# Altium footprint library RF Module.PcbLib: 28 footprints (part 1 of 2)
Each footprint in its own frame and in the unit in brackets; x right, y up, seen from the top. Pads: shape width x height; smd on the part's side, far side on the other; paste and mask are expansions set on the pad; w line width, h text height; cw(c..) or ccw(c..) is an arc to the next point about the centre after c.
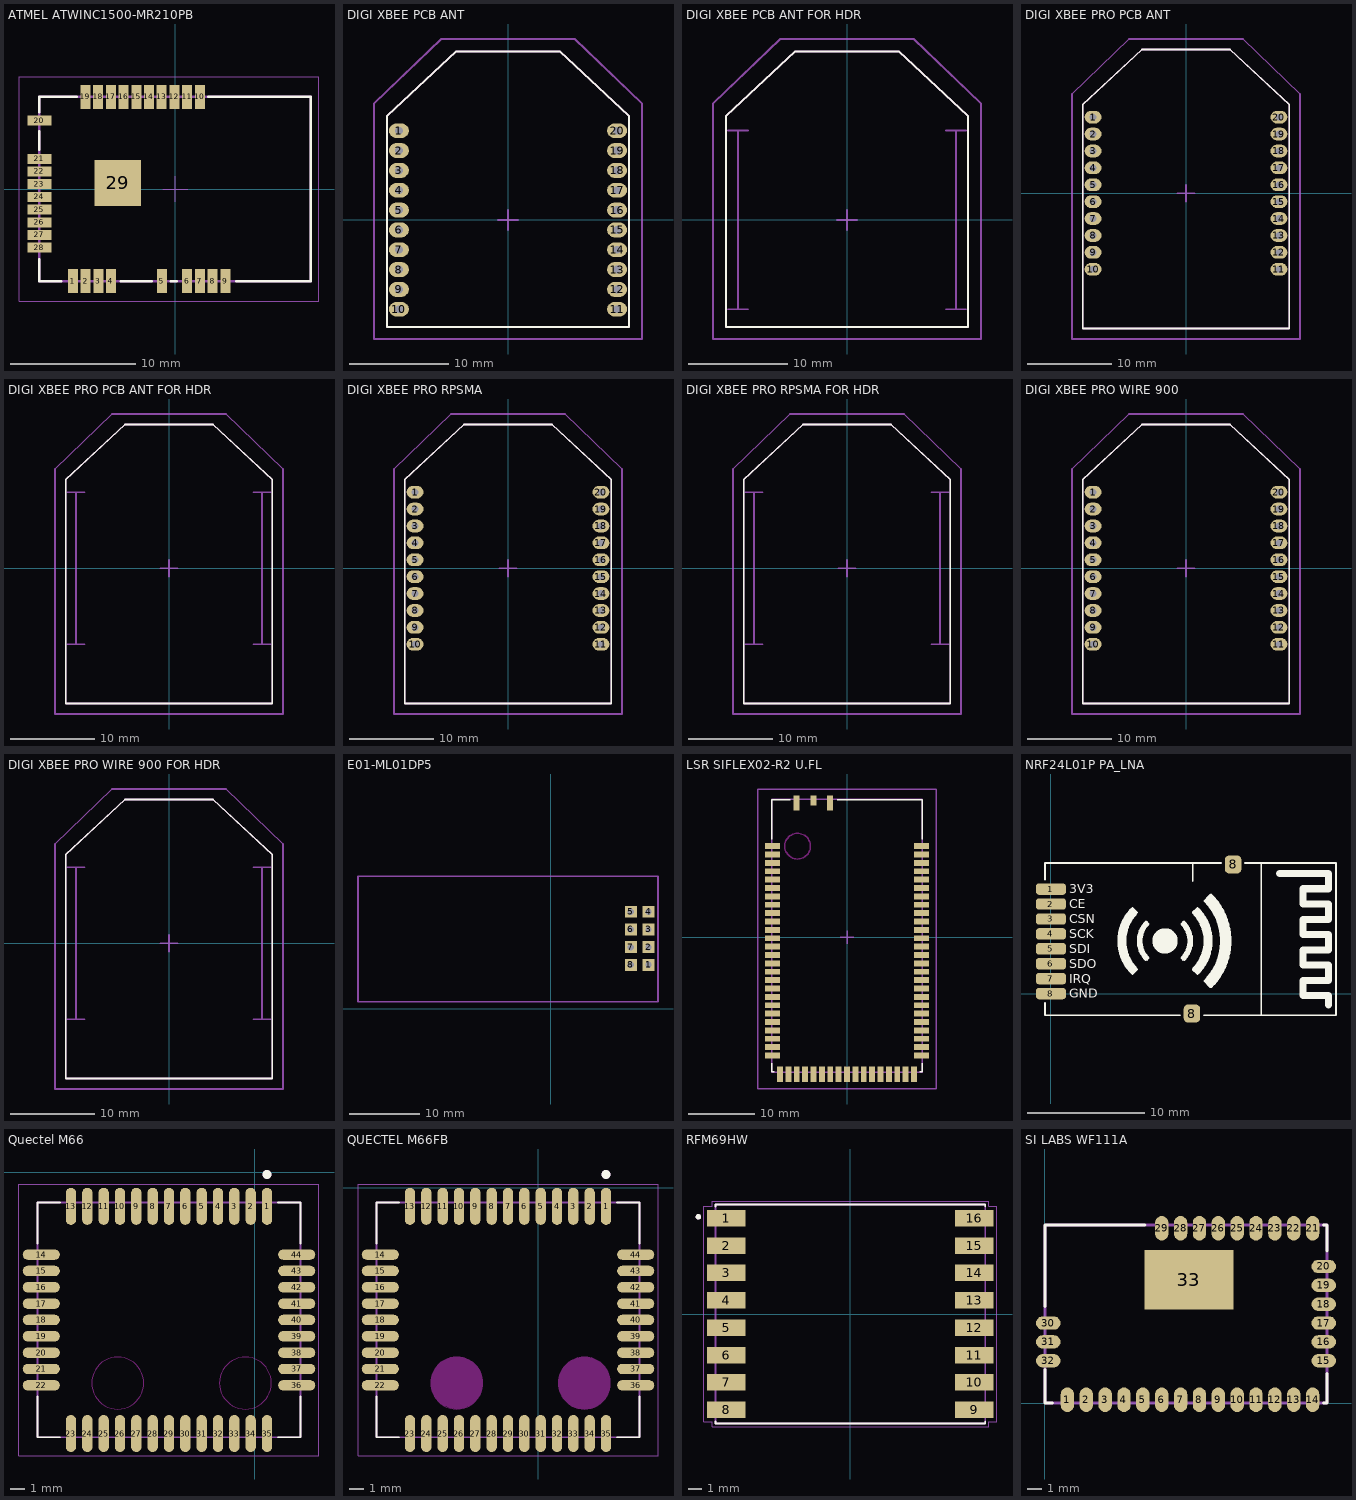
[diagram p0: the footprints below, top view; thin cyan lines are the x and y axes]

## ATMEL ATWINC1500-MR210PB [mm]
height 2.2
pads (29):
  rect 0.8x1.9 smd: 1(-8.19,-7.365) 2(-7.174,-7.365) 3(-6.158,-7.365) 4(-5.142,-7.365) 5(-1.078,-7.365) 6(0.954,-7.365) 7(1.97,-7.365) 8(2.986,-7.365) 9(4.002,-7.365) 10(1.964,7.365) 11(0.948,7.365) 12(-0.068,7.365) 13(-1.084,7.365) 14(-2.1,7.365) 15(-3.116,7.365) 16(-4.132,7.365) 17(-5.148,7.365) 18(-6.164,7.365) 19(-7.18,7.365)
  rect 1.9x0.8 smd: 20(-10.86,5.465) 21(-10.86,2.417) 22(-10.86,1.401) 23(-10.86,0.385) 24(-10.86,-0.631) 25(-10.86,-1.647) 26(-10.86,-2.663) 27(-10.86,-3.679) 28(-10.86,-4.695)
  rect 3.7x3.7 smd: 29(-4.59,0.485)
Top Overlay:
  lines w0.2: -10.86,-5.615 -10.86,-7.365 -9.11,-7.365 ; -10.86,3.135 -10.86,4.635 ; -10.86,6.135 -10.86,7.365 -7.86,7.365 ; -4.36,-7.365 -1.86,-7.365 ; -0.36,-7.365 0.14,-7.365 ; 2.64,7.365 10.86,7.365 10.86,-7.365 4.89,-7.365
Mechanical 1:
  lines w0.2: -10.86,-7.365 -10.86,7.365 10.86,7.365 10.86,-7.365 -10.86,-7.365
Mechanical 15:
  lines w0.1: -1,0 1,0 ; 0,-1 0,1 ; -12.5,-9 11.5,-9 11.5,9 -12.5,9 -12.5,-9
3D body "ATWINC1500-MR210PB.STEP": height 2.2, standoff 0, extent -10.86,-7.365 10.86,7.365

## DIGI XBEE PCB ANT [mm]
height 4
pads (20):
  oval 2x1.5 hole 0.8: 1(-11,9) 2(-11,7) 3(-11,5) 4(-11,3) 5(-11,1) 6(-11,-1) 7(-11,-3) 8(-11,-5) 9(-11,-7) 10(-11,-9) 11(11,-9) 12(11,-7) 13(11,-5) 14(11,-3) 15(11,-1) 16(11,1) 17(11,3) 18(11,5) 19(11,7) 20(11,9)
Top Overlay:
  lines w0.2: -12.2,-10.8 0,-10.8 12.2,-10.8 12.2,10.5 5.2,17 0,17 -5.2,17 -12.2,10.5 -12.2,-10.8
Mechanical 1:
  lines w0.2: -12.2,-10.8 -12.2,10.5 -5.2,17 0,17 5.2,17 12.2,10.5 12.2,-10.8 0,-10.8 -12.2,-10.8
Mechanical 15:
  lines w0.2: -1,0 1,0 ; 0,-1 0,1 ; -13.5,-12 -13.5,11.75 -6.75,18.25 6.75,18.25 13.5,11.75 13.5,-12 -13.5,-12
3D body "XBee PCB Antenna.STEP": height 3.58, standoff -4.17, extent -12.192,-10.8 12.192,16.97

## DIGI XBEE PCB ANT FOR HDR [mm]
height 8.4
Top Overlay:
  lines w0.2: -12.2,-10.8 0,-10.8 12.2,-10.8 12.2,10.5 5.2,17 0,17 -5.2,17 -12.2,10.5 -12.2,-10.8
Mechanical 1:
  lines w0.2: -12,-9 -11,-9 ; -12,9 -11,9 ; -10,-9 -11,-9 ; -10,9 -11,9 ; 10,-9 11,-9 ; 10,9 11,9 ; 12,-9 11,-9 ; 12,9 11,9 ; -11,-9 -11,9 ; 11,-9 11,9 ; -12.2,-10.8 -12.2,10.5 -5.2,17 0,17 5.2,17 12.2,10.5 12.2,-10.8 0,-10.8 -12.2,-10.8
Mechanical 15:
  lines w0.2: -1,0 1,0 ; 0,-1 0,1 ; -13.5,-12 -13.5,11.75 -6.75,18.25 6.75,18.25 13.5,11.75 13.5,-12 -13.5,-12
3D body "XBee PCB Antenna.STEP": height 7.98, standoff 0.23, extent -12.192,-10.8 12.192,16.97

## DIGI XBEE PRO PCB ANT [mm]
height 4
pads (20):
  oval 2x1.5 hole 0.8: 1(-11,9) 2(-11,7) 3(-11,5) 4(-11,3) 5(-11,1) 6(-11,-1) 7(-11,-3) 8(-11,-5) 9(-11,-7) 10(-11,-9) 11(11,-9) 12(11,-7) 13(11,-5) 14(11,-3) 15(11,-1) 16(11,1) 17(11,3) 18(11,5) 19(11,7) 20(11,9)
Top Overlay:
  lines w0.2: -12.2,-16 12.2,-16 12.2,10.5 5.2,17 0,17 -5.2,17 -12.2,10.5 -12.2,-16
Mechanical 1:
  lines w0.2: -12.2,-16 -12.2,10.5 -5.2,17 0,17 5.2,17 12.2,10.5 12.2,-16 -12.2,-16
Mechanical 15:
  lines w0.2: -1,0 1,0 ; 0,-1 0,1 ; -13.5,-17.25 -13.5,11.75 -6.75,18.25 6.75,18.25 13.5,11.75 13.5,-17.25 -13.5,-17.25
3D body "XBee Pro PCB Antenna.STEP": height 3.58, standoff -4.17, extent -12.192,-15.97 12.192,16.97

## DIGI XBEE PRO PCB ANT FOR HDR [mm]
height 4
Top Overlay:
  lines w0.2: -12.2,-16 -12.2,10.5 -5.2,17 0,17 5.2,17 12.2,10.5 12.2,-16 -12.2,-16
Mechanical 1:
  lines w0.2: -12,-9 -11,-9 ; -12,9 -11,9 ; -10,-9 -11,-9 ; -10,9 -11,9 ; 10,-9 11,-9 ; 10,9 11,9 ; 12,-9 11,-9 ; 12,9 11,9 ; -11,-9 -11,9 ; 11,-9 11,9 ; -12.2,-16 12.2,-16 12.2,10.5 5.2,17 0,17 -5.2,17 -12.2,10.5 -12.2,-16
Mechanical 15:
  lines w0.2: -1,0 1,0 ; 0,-1 0,1 ; -13.5,-17.25 13.5,-17.25 13.5,11.75 6.75,18.25 -6.75,18.25 -13.5,11.75 -13.5,-17.25
3D body "XBee Pro PCB Antenna.STEP": height 3.58, standoff -4.17, extent -12.192,-15.97 12.192,16.97

## DIGI XBEE PRO RPSMA [mm]
height 4
pads (20):
  oval 2x1.5 hole 0.8: 1(-11,9) 2(-11,7) 3(-11,5) 4(-11,3) 5(-11,1) 6(-11,-1) 7(-11,-3) 8(-11,-5) 9(-11,-7) 10(-11,-9) 11(11,-9) 12(11,-7) 13(11,-5) 14(11,-3) 15(11,-1) 16(11,1) 17(11,3) 18(11,5) 19(11,7) 20(11,9)
Top Overlay:
  lines w0.2: -12.2,-16 12.2,-16 12.2,10.5 5.2,17 0,17 -5.2,17 -12.2,10.5 -12.2,-16
Mechanical 1:
  lines w0.2: -12.2,-16 -12.2,10.5 -5.2,17 0,17 5.2,17 12.2,10.5 12.2,-16 -12.2,-16
Mechanical 15:
  lines w0.2: -1,0 1,0 ; 0,-1 0,1 ; -13.5,-17.25 -13.5,11.75 -6.75,18.25 6.75,18.25 13.5,11.75 13.5,-17.25 -13.5,-17.25
3D body "XBee Pro wRPSMA.STEP": height 7.27, standoff -4.17, extent -12.192,-15.97 12.192,29.97

## DIGI XBEE PRO RPSMA FOR HDR [mm]
height 12.4
Top Overlay:
  lines w0.2: -12.2,-16 -12.2,10.5 -5.2,17 0,17 5.2,17 12.2,10.5 12.2,-16 -12.2,-16
Mechanical 1:
  lines w0.2: -12,-9 -11,-9 ; -12,9 -11,9 ; -10,-9 -11,-9 ; -10,9 -11,9 ; 10,-9 11,-9 ; 10,9 11,9 ; 12,-9 11,-9 ; 12,9 11,9 ; -11,-9 -11,9 ; 11,-9 11,9 ; -12.2,-16 12.2,-16 12.2,10.5 5.2,17 0,17 -5.2,17 -12.2,10.5 -12.2,-16
Mechanical 15:
  lines w0.2: -1,0 1,0 ; 0,-1 0,1 ; -13.5,-17.25 13.5,-17.25 13.5,11.75 6.75,18.25 -6.75,18.25 -13.5,11.75 -13.5,-17.25
3D body "XBee Pro wRPSMA.STEP": height 11.67, standoff 0.23, extent -12.192,-15.97 12.192,29.97

## DIGI XBEE PRO WIRE 900 [mm]
height 4
pads (20):
  oval 2x1.5 hole 0.8: 1(-11,9) 2(-11,7) 3(-11,5) 4(-11,3) 5(-11,1) 6(-11,-1) 7(-11,-3) 8(-11,-5) 9(-11,-7) 10(-11,-9) 11(11,-9) 12(11,-7) 13(11,-5) 14(11,-3) 15(11,-1) 16(11,1) 17(11,3) 18(11,5) 19(11,7) 20(11,9)
Top Overlay:
  lines w0.2: -12.2,-16 12.2,-16 12.2,10.5 5.2,17 0,17 -5.2,17 -12.2,10.5 -12.2,-16
Mechanical 1:
  lines w0.2: -12.2,-16 -12.2,10.5 -5.2,17 0,17 5.2,17 12.2,10.5 12.2,-16 -12.2,-16
Mechanical 15:
  lines w0.2: -1,0 1,0 ; 0,-1 0,1 ; -13.5,-17.25 -13.5,11.75 -6.75,18.25 6.75,18.25 13.5,11.75 13.5,-17.25 -13.5,-17.25
3D body "XBee Pro Wire 900.STEP": height 77.88, standoff -4.17, extent -12.192,-15.97 12.192,16.97

## DIGI XBEE PRO WIRE 900 FOR HDR [mm]
height 8.4
Top Overlay:
  lines w0.2: -12.2,-16 -12.2,10.5 -5.2,17 0,17 5.2,17 12.2,10.5 12.2,-16 -12.2,-16
Mechanical 1:
  lines w0.2: -12,-9 -11,-9 ; -12,9 -11,9 ; -10,-9 -11,-9 ; -10,9 -11,9 ; 10,-9 11,-9 ; 10,9 11,9 ; 12,-9 11,-9 ; 12,9 11,9 ; -11,-9 -11,9 ; 11,-9 11,9 ; -12.2,-16 12.2,-16 12.2,10.5 5.2,17 0,17 -5.2,17 -12.2,10.5 -12.2,-16
Mechanical 15:
  lines w0.2: -1,0 1,0 ; 0,-1 0,1 ; -13.5,-17.25 13.5,-17.25 13.5,11.75 6.75,18.25 -6.75,18.25 -13.5,11.75 -13.5,-17.25
3D body "XBee Pro Wire 900.STEP": height 82.28, standoff 0.23, extent -12.192,-15.97 12.192,16.97

## E01-ML01DP5 [mm]
pads (8):
  rect 1.7x1.7 hole 0.9: 1(13.995,6.299) 2(13.995,8.839) 3(13.995,11.379) 4(13.995,13.919) 5(11.455,13.919) 6(11.455,11.379) 7(11.455,8.839) 8(11.455,6.299)
Mechanical 1:
  lines w0.254: -27.635,1.016 15.342,1.016 15.342,15.189 15.342,18.999 -27.635,18.999 -27.635,14.58 -27.635,1.016
3D body "wireless Module.stp": height 12.65, standoff 2.6, extent -27.581,1.016 15.469,19.066
3D body "HDR2.54-1P_M.STEP": height 8.5, standoff -3, extent 12.725,5.029 15.265,7.569
3D body "HDR2.54-1P_M.STEP": height 8.5, standoff -3, extent 10.185,5.029 12.725,7.569
3D body "HDR2.54-1P_M.STEP": height 8.5, standoff -3, extent 12.725,7.569 15.265,10.109
3D body "HDR2.54-1P_M.STEP": height 8.5, standoff -3, extent 10.185,7.569 12.725,10.109
3D body "HDR2.54-1P_M.STEP": height 8.5, standoff -3, extent 12.725,10.109 15.265,12.649
3D body "HDR2.54-1P_M.STEP": height 8.5, standoff -3, extent 10.185,10.109 12.725,12.649
3D body "HDR2.54-1P_M.STEP": height 8.5, standoff -3, extent 12.725,12.649 15.265,15.189
3D body "HDR2.54-1P_M.STEP": height 8.5, standoff -3, extent 10.185,12.649 12.725,15.189

## LSR SIFLEX02-R2 U.FL [mil]
height 200.79
pads (72):
  rect 90x35 smd: 1(-445,544.51) 2(-445,494.51) 3(-445,444.51) 4(-445,394.51) 5(-445,344.51) 6(-445,294.51) 7(-445,244.51) 8(-445,194.51) 9(-445,144.51) 10(-445,94.51) 11(-445,44.51) 12(-445,-5.49) 13(-445,-55.49) 14(-445,-105.49) 15(-445,-155.49) 16(-445,-205.49) 17(-445,-255.49) 18(-445,-305.49) 19(-445,-355.49) 20(-445,-405.49) 21(-445,-455.49) 22(-445,-505.49) 23(-445,-555.49) 24(-445,-605.49) 25(-445,-655.49) 26(-445,-705.49) 44(445,-705.49) 45(445,-655.49) 46(445,-605.49) 47(445,-555.49) 48(445,-505.49) 49(445,-455.49) 50(445,-405.49) 51(445,-355.49) 52(445,-305.49) 53(445,-255.49) 54(445,-205.49) 55(445,-155.49) 56(445,-105.49) 57(445,-55.49) 58(445,-5.49) 59(445,44.51) 60(445,94.51) 61(445,144.51) 62(445,194.51) 63(445,244.51) 64(445,294.51) 65(445,344.51) 66(445,394.51) 67(445,444.51) 68(445,494.51) 69(445,544.51)
  rect 35x90 smd: 27(-400,-817.49) 28(-350,-817.49) 29(-300,-817.49) 30(-250,-817.49) 31(-200,-817.49) 32(-150,-817.49) 33(-100,-817.49) 34(-50,-817.49) 35(0,-817.49) 36(50,-817.49) 37(100,-817.49) 38(150,-817.49) 39(200,-817.49) 40(250,-817.49) 41(300,-817.49) 42(350,-817.49) 43(400,-817.49) 70(-100.5,802.51) 72(-300.5,802.49)
  rect 35x60 smd: 71(-200.5,817.49)
Top Overlay:
  lines w7.87: -448.82,-752.51 -448.82,-803.69 -433.07,-803.69 ; -448.82,586.07 -448.82,822.29 -338.58,822.29 ; -59.06,822.29 448.82,822.29 448.82,586.07 ; 433.07,-803.69 448.82,-803.69 448.82,-752.51
Keep-Out Layer:
  circle w7.87: c-295,544.51 r76.87
Mechanical 1:
  lines w7.87: -450,-804.71 450,-804.71 450,825.29 -450,825.29 -450,-804.71
Mechanical 15:
  lines w7.87: -39.37,0 39.37,0 ; 0,-39.37 0,39.37 ; -531.5,-905.51 531.5,-905.51 531.5,885.83 -531.5,885.83 -531.5,-905.51
3D body "LSR SIFlex02-R2 450-0016-R1.STEP": height 176.7, standoff -0.5, extent -450,-804.71 450,825.29

## NRF24L01P PA_LNA [mil]
pads (10):
  rrect50% 100x38 smd: 1(0,350) 2(0,300) 3(0,250) 4(0,200) 5(0,150) 6(0,100) 7(0,50) 8(0,0)
  rrect50% 55x60 smd: 8(472.44,-66.93) 8(610.24,432.68)
Top Overlay:
  circle w45: c382,176.4 r20
  lines w6: -20,-31.5 -20,-72.6 433.07,-72.6 ; -20,381.89 -20,437.4 570.87,437.4 ; 474.84,377.4 474.84,437.4 ; 511.81,-72.6 955,-72.6 955,437.4 649.61,437.4 ; 704.92,-72.6 704.92,437.4
  lines w10: 266.5,73.9 273,67.4 287,81.4 282,86.4 ; 267,279.4 273,285.4 287,271.4 282,266.4 ; 314,118.4 319,113.4 325,119.4 320,124.4 ; 314,234.4 319,239.4 325,233.4 320,228.4 ; 444,124.4 439,119.4 445,113.4 450,118.4 ; 444,228.4 439,233.4 445,239.4 450,234.4 ; 482,86.4 477,81.4 491,67.4 497,73.4 ; 482,266.4 477,271.4 491,285.4 497.5,278.9 ; 525.5,51.9 516,42.4 535.5,22.9 545,32.4 ; 526,300.4 516,310.4 535.5,329.9 544.5,320.9
  lines w19: 318.58,120.03 cw(c382,176.4) 318.63,232.84 ; 445.37,119.97 ccw(c382,176.4) 445.42,232.77
  lines w23.62: 765,402.4 929.41,402.4 929.41,351.22 845,351.22 845,300.04 929.41,300.04 929.41,248.86 845,248.86 845,197.68 929.41,197.68 929.41,146.5 845,146.5 845,95.31 929.41,95.31 929.41,44.13 845,44.13 845,-7.05 929.41,-7.05 929.41,-37.6
  lines w30: 272.76,82.2 cw(c382,176.4) 272.76,270.61 ; 491.24,82.2 ccw(c382,176.4) 491.24,270.61
  lines w38: 535.57,42.65 ccw(c382,176.4) 535.57,310.15
  text "GND" at 61,-14.6 h30
  text "IRQ" at 61,35.4 h30
  text "SDO" at 61,85.4 h30
  text "SDI" at 61,135.4 h30
  text "SCK" at 61,185.4 h30
  text "CSN" at 61,235.4 h30
  text "3V3" at 61,335.4 h30
  text "CE" at 61,285.4 h30
Mechanical 14:
  text ".Designator" at 187.01,177.17 h50
3D body "RF.step": height 46.5, standoff -0.8, extent -15,-67.6 950,432.4

## Quectel M66 [mm]
pads (44):
  oval 0.7x2.5 smd: 1(0.822,-2.286) 2(-0.278,-2.286) 3(-1.378,-2.286) 4(-2.478,-2.286) 5(-3.578,-2.286) 6(-4.678,-2.286) 7(-5.778,-2.286) 8(-6.878,-2.286) 9(-7.978,-2.286) 10(-9.078,-2.286) 11(-10.178,-2.286) 12(-11.278,-2.286) 13(-12.378,-2.286) 23(-12.378,-17.586) 24(-11.278,-17.586) 25(-10.178,-17.586) 26(-9.078,-17.586) 27(-7.978,-17.586) 28(-6.878,-17.586) 29(-5.778,-17.586) 30(-4.678,-17.586) 31(-3.578,-17.586) 32(-2.478,-17.586) 33(-1.378,-17.586) 34(-0.278,-17.586) 35(0.822,-17.586)
  oval 2.5x0.7 smd: 14(-14.378,-5.536) 15(-14.378,-6.636) 16(-14.378,-7.736) 17(-14.378,-8.836) 18(-14.378,-9.936) 19(-14.378,-11.036) 20(-14.378,-12.136) 21(-14.378,-13.236) 22(-14.378,-14.336) 36(2.822,-14.336) 37(2.822,-13.236) 38(2.822,-12.136) 39(2.822,-11.036) 40(2.822,-9.936) 41(2.822,-8.836) 42(2.822,-7.736) 43(2.822,-6.636) 44(2.822,-5.536)
Top Overlay:
  circle w0.3: c0.822,-0.136 r0.15
  lines w0.127: -14.628,-15.086 -14.628,-17.836 -13.128,-17.836 ; -14.628,-4.786 -14.628,-2.036 -13.128,-2.036 ; 1.572,-17.836 3.072,-17.836 3.072,-15.086 ; 1.572,-2.036 3.072,-2.036 3.072,-4.786
Keep-Out Layer:
  circle w0: c-9.228,-14.186 r1.75
  circle w0: c-0.628,-14.186 r1.75
  circle w0: c-0.628,-14.186 r1.75
  circle w0: c-9.228,-14.186 r1.75
  circle w0: c-9.228,-14.186 r1.75
  circle w0: c-0.628,-14.186 r1.75
  circle w0: c-0.628,-14.186 r1.75
  circle w0: c-9.228,-14.186 r1.75
  circle w0: c-9.228,-14.186 r1.75
  circle w0: c-0.628,-14.186 r1.75
  circle w0: c-0.628,-14.186 r1.75
  circle w0: c-9.228,-14.186 r1.75
Mechanical 4:
  circle w0.3: c0.822,-0.136 r0.15
  circle w0.3: c0.822,-0.136 r0.15
  lines w0.127: -14.628,-17.836 3.072,-17.836 ; -14.628,-17.836 -14.628,-2.036 ; -14.628,-17.836 3.072,-17.836 ; -14.628,-17.836 -14.628,-2.036 ; -14.628,-2.036 3.072,-2.036 ; -14.628,-2.036 3.072,-2.036 ; 3.072,-17.836 3.072,-2.036 ; 3.072,-17.836 3.072,-2.036
Mechanical 16:
  lines w0.05: -15.878,-19.086 -15.878,-0.786 4.322,-0.786 4.322,-19.086 -15.878,-19.086

## QUECTEL M66FB [mm]
height 0.4
pads (44):
  oval 0.7x2.5 smd: 1(4.568,-1.24) 2(3.468,-1.24) 3(2.368,-1.24) 4(1.268,-1.24) 5(0.168,-1.24) 6(-0.932,-1.24) 7(-2.032,-1.24) 8(-3.132,-1.24) 9(-4.232,-1.24) 10(-5.332,-1.24) 11(-6.432,-1.24) 12(-7.532,-1.24) 13(-8.632,-1.24) 23(-8.632,-16.54) 24(-7.532,-16.54) 25(-6.432,-16.54) 26(-5.332,-16.54) 27(-4.232,-16.54) 28(-3.132,-16.54) 29(-2.032,-16.54) 30(-0.932,-16.54) 31(0.168,-16.54) 32(1.268,-16.54) 33(2.368,-16.54) 34(3.468,-16.54) 35(4.568,-16.54)
  oval 2.5x0.7 smd: 14(-10.632,-4.49) 15(-10.632,-5.59) 16(-10.632,-6.69) 17(-10.632,-7.79) 18(-10.632,-8.89) 19(-10.632,-9.99) 20(-10.632,-11.09) 21(-10.632,-12.19) 22(-10.632,-13.29) 36(6.568,-13.29) 37(6.568,-12.19) 38(6.568,-11.09) 39(6.568,-9.99) 40(6.568,-8.89) 41(6.568,-7.79) 42(6.568,-6.69) 43(6.568,-5.59) 44(6.568,-4.49)
Top Overlay:
  circle w0.3: c4.568,0.91 r0.15
  lines w0.127: -10.882,-14.04 -10.882,-16.79 -9.382,-16.79 ; -10.882,-3.74 -10.882,-0.99 -9.382,-0.99 ; 5.318,-16.79 6.818,-16.79 6.818,-14.04 ; 5.318,-0.99 6.818,-0.99 6.818,-3.74
Keep-Out Layer:
  board cut-out: -7.218,-13.131 -7.218,-13.303 -7.151,-13.641 -7.019,-13.96 -6.827,-14.246 -6.583,-14.49 -6.297,-14.682 -5.978,-14.814 -5.64,-14.881 -5.468,-14.881 -5.295,-14.881 -4.957,-14.814 -4.639,-14.682 -4.352,-14.49 -4.108,-14.246 -3.917,-13.96 -3.785,-13.641 -3.718,-13.303 -3.718,-13.131 -3.718,-12.958 -3.785,-12.62 -3.917,-12.302 -4.108,-12.015 -4.352,-11.772 -4.639,-11.58 -4.957,-11.448 -5.295,-11.381 -5.468,-11.381 -5.64,-11.381 -5.978,-11.448 -6.297,-11.58 -6.583,-11.772 -6.827,-12.015 -7.019,-12.302 -7.151,-12.62 -7.218,-12.958
  board cut-out: 1.368,-13.14 1.368,-13.312 1.435,-13.65 1.567,-13.969 1.759,-14.256 2.002,-14.499 2.289,-14.691 2.608,-14.823 2.946,-14.89 3.118,-14.89 3.29,-14.89 3.628,-14.823 3.947,-14.691 4.234,-14.499 4.477,-14.256 4.669,-13.969 4.801,-13.65 4.868,-13.312 4.868,-13.14 4.868,-12.968 4.801,-12.63 4.669,-12.311 4.477,-12.024 4.234,-11.781 3.947,-11.589 3.628,-11.457 3.29,-11.39 3.118,-11.39 2.946,-11.39 2.608,-11.457 2.289,-11.589 2.002,-11.781 1.759,-12.024 1.567,-12.311 1.435,-12.63 1.368,-12.968
Keep-Out Layer:
  circle w0: c3.118,-13.14 r1.75
  circle w0: c-5.482,-13.14 r1.75
Mechanical 4:
  circle w0.3: c4.568,0.91 r0.15
  circle w0.3: c4.568,0.91 r0.15
  lines w0.127: -10.882,-16.79 -10.882,-0.99 ; -10.882,-16.79 6.818,-16.79 ; -10.882,-16.79 -10.882,-0.99 ; -10.882,-16.79 6.818,-16.79 ; -10.882,-0.99 6.818,-0.99 ; -10.882,-0.99 6.818,-0.99 ; 6.818,-16.79 6.818,-0.99 ; 6.818,-16.79 6.818,-0.99
Mechanical 16:
  lines w0.05: -12.132,-18.04 8.068,-18.04 8.068,0.26 -12.132,0.26 -12.132,-18.04
3D body: height 0, standoff 0, extent -12.157,-18 8.093,0.25
3D body "User Library-Quecte_M66.STEP": height -0.51, standoff -2.81, extent -10.882,-16.816 6.818,-1.016

## RFM69HW [mm]
pads (16):
  rect 2.81x1.21 smd: 1(-9.025,7) 2(-9.025,5) 3(-9.025,3) 4(-9.025,1) 5(-9.025,-1) 6(-9.025,-3) 7(-9.025,-5) 8(-9.025,-7) 9(9.075,-7) 10(9.075,-5) 11(9.075,-3) 12(9.075,-1) 13(9.075,1) 14(9.075,3) 15(9.075,5) 16(9.075,7)
Top Overlay:
  circle w0.2: c-11.075,7.1 r0.1
  lines w0.127: -9.825,-7.85 -9.825,-8 9.875,-8 9.875,-7.85 ; -9.825,7.85 -9.825,8 9.875,8 9.875,7.85
Mechanical 13:
  circle w0.2: c-11.075,7.1 r0.1
  lines w0.127: -9.825,-8 -9.825,8 9.875,8 9.875,-8 -9.825,-8
Mechanical 15:
  lines w0.05: -10.685,-7.86 -10.075,-7.86 -10.075,-8.25 10.125,-8.25 10.125,-7.86 10.735,-7.86 10.735,7.86 10.125,7.86 10.125,8.25 -10.075,8.25 -10.075,7.86 -10.685,7.86 -10.685,-7.86
3D body "RFM69HW-868S2--3DModel-STEP-1.STEP": height 1.9, standoff 0, extent -9.799,-7.974 9.901,8.026

## SI LABS WF111A [mm]
height 2.1
pads (33):
  oval 0.9x1.65 smd: 1(1.515,0.225) 2(2.785,0.225) 3(4.055,0.225) 4(5.325,0.225) 5(6.595,0.225) 6(7.865,0.225) 7(9.135,0.225) 8(10.405,0.225) 9(11.675,0.225) 10(12.945,0.225) 11(14.215,0.225) 12(15.485,0.225) 13(16.755,0.225) 14(18.025,0.225) 21(18.025,11.775) 22(16.755,11.775) 23(15.485,11.775) 24(14.215,11.775) 25(12.945,11.775) 26(11.675,11.775) 27(10.405,11.775) 28(9.135,11.775) 29(7.865,11.775)
  oval 1.65x0.9 smd: 15(18.775,2.85) 16(18.775,4.12) 17(18.775,5.39) 18(18.775,6.66) 19(18.775,7.93) 20(18.775,9.2) 30(0.225,5.39) 31(0.225,4.12) 32(0.225,2.85)
  rect 6x4 smd: 33(9.7,8.3)
Top Overlay:
  lines w0.2: 0,2.25 0,0 0.5,0 ; 0,6.5 0,12 6.75,12 ; 18.75,0 19,0 19,2 ; 18.75,12 19,12 19,10.25
Mechanical 1:
  lines w0.2: 0,0 0,12 19,12 19,0 0,0
3D body "WF111A.STEP": height 2.1, standoff 0, extent 0,0 19,12